# Altium footprint library Connektor.PcbLib: 305 footprints (part 18 of 20)
Each footprint in its own frame and in the unit in brackets; x right, y up, seen from the top. Pads: shape width x height; smd on the part's side, far side on the other; paste and mask are expansions set on the pad; w line width, h text height; cw(c..) or ccw(c..) is an arc to the next point about the centre after c.
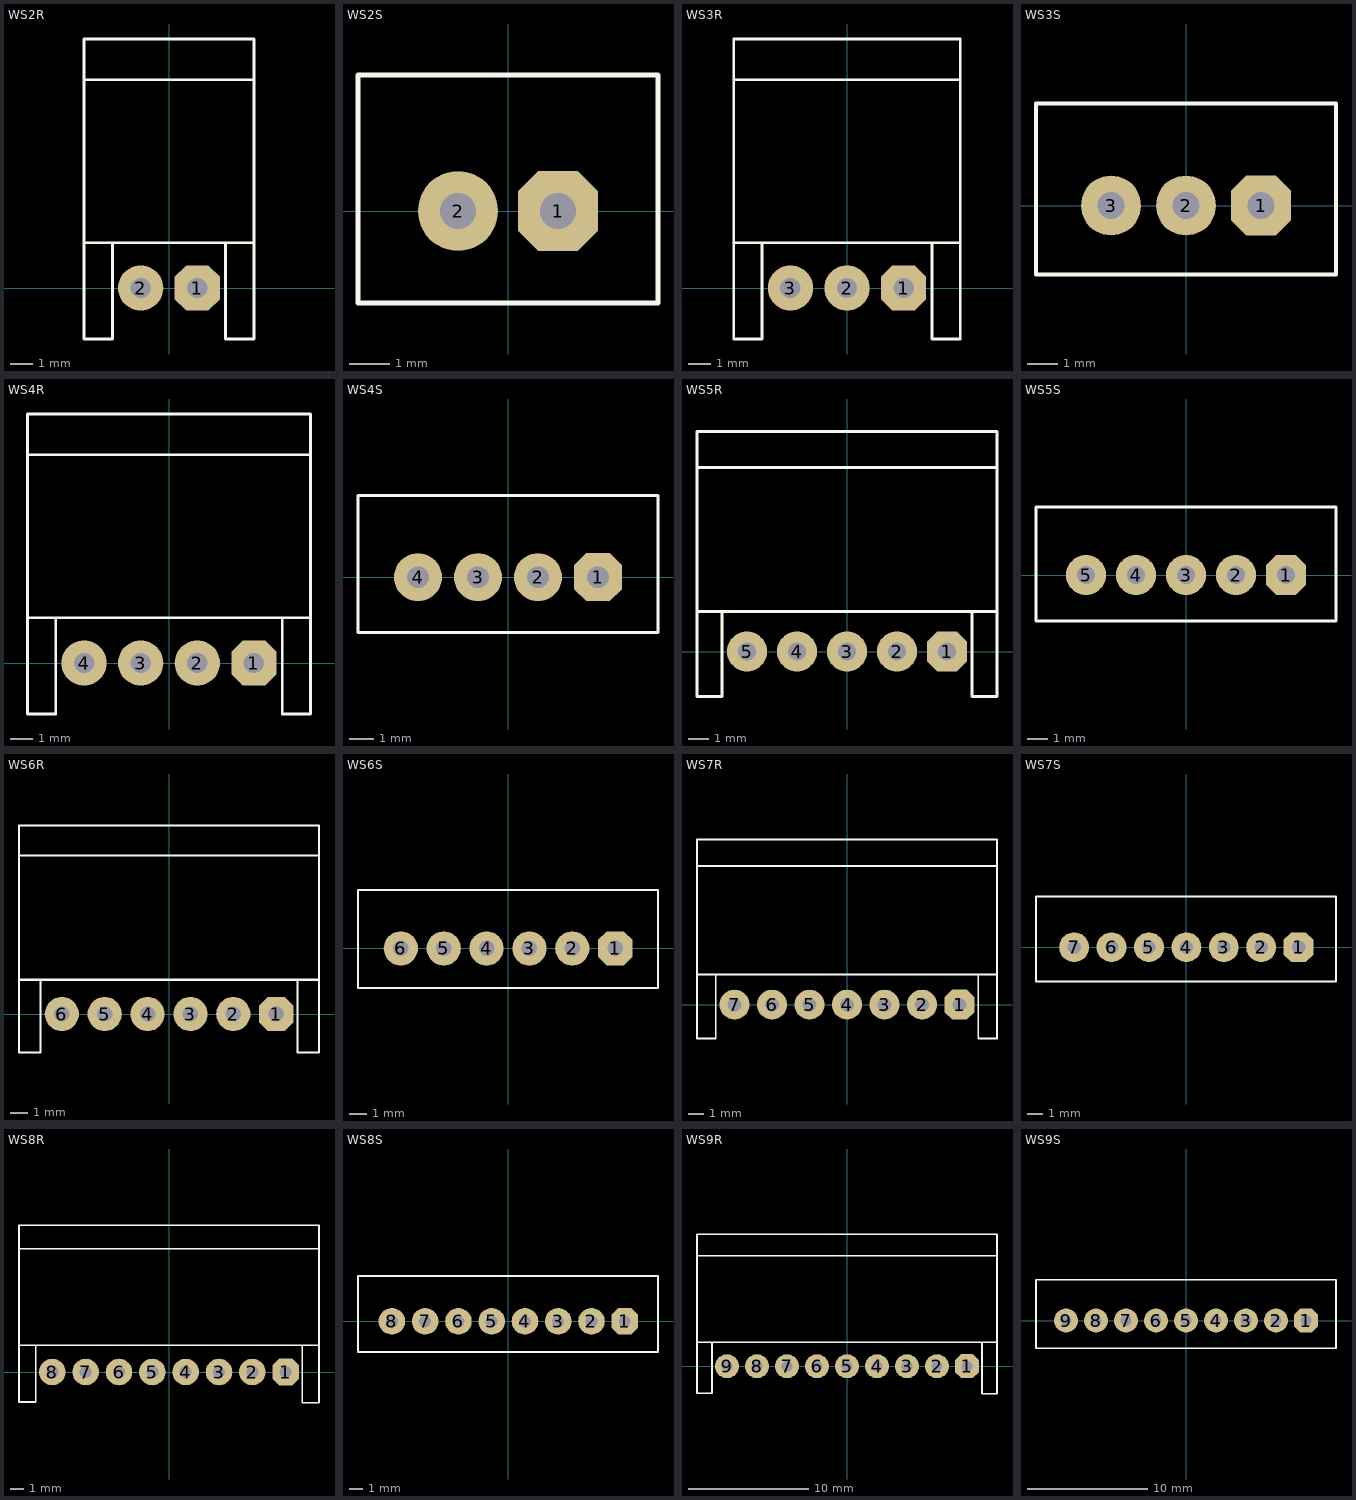
[diagram p17: the footprints below, top view; thin cyan lines are the x and y axes]

## WS2R [mm]
pads (2):
  oct 2x2 hole 0.9: 1(1.25,0)
  round 2 hole 0.9: 2(-1.25,0)
TopOverlay:
  lines w0.127: -3.75,2 3.75,2 ; -3.7,9.2 3.7,9.2 ; -2.5,2 -2.5,-2.25 -3.75,-2.25 -3.75,11 3.75,11 3.75,-2.25 2.5,-2.25 2.5,2
3D body: height 6.1, standoff -2, extent -3.7,-2.3 3.7,9.2

## WS2S [mm]
pads (2):
  oct 2x2 hole 0.9: 1(1.25,0)
  round 2 hole 0.9: 2(-1.25,0)
TopOverlay:
  lines w0.127: -3.75,-2.3 -3.75,3.4 3.75,3.4 3.75,-2.3 -3.75,-2.3
3D body: height 7.7, standoff -2.5, extent -3.75,-2.3 3.75,3.4

## WS3R [mm]
pads (3):
  oct 2x2 hole 0.9: 1(2.5,0)
  round 2 hole 0.9: 2(0,0) 3(-2.5,0)
TopOverlay:
  lines w0.127: -5,2 5,2 ; -4.95,9.2 4.95,9.2 ; -3.75,2 -3.75,-2.25 -5,-2.25 -5,11 5,11 5,-2.25 3.75,-2.25 3.75,2
3D body: height 6.1, standoff -2, extent -4.95,-2.3 4.95,9.2

## WS3S [mm]
pads (3):
  oct 2x2 hole 0.9: 1(2.5,0)
  round 2 hole 0.9: 2(0,0) 3(-2.5,0)
TopOverlay:
  lines w0.127: -5,-2.3 5,-2.3 5,3.4 -5,3.4 -5,-2.3
3D body: height 7.7, standoff -2.5, extent -5,-2.3 5,3.4

## WS4R [mm]
pads (4):
  oct 2x2 hole 0.9: 1(3.75,0)
  round 2 hole 0.9: 2(1.25,0) 3(-1.25,0) 4(-3.75,0)
TopOverlay:
  lines w0.127: -6.25,2 6.25,2 ; -6.2,9.2 6.2,9.2 ; -5,2 -5,-2.25 -6.25,-2.25 -6.25,11 6.25,11 6.25,-2.25 5,-2.25 5,2
3D body: height 6.1, standoff -2, extent -6.2,-2.3 6.2,9.2

## WS4S [mm]
pads (4):
  oct 2x2 hole 0.9: 1(3.75,0)
  round 2 hole 0.9: 2(1.25,0) 3(-1.25,0) 4(-3.75,0)
TopOverlay:
  lines w0.127: -6.25,-2.3 6.25,-2.3 6.25,3.4 -6.25,3.4 -6.25,-2.3
3D body: height 7.7, standoff -2.5, extent -6.25,-2.3 6.25,3.4

## WS5R [mm]
pads (5):
  oct 2x2 hole 0.9: 1(5,0)
  round 2 hole 0.9: 2(2.5,0) 3(0,0) 4(-2.5,0) 5(-5,0)
TopOverlay:
  lines w0.127: -7.5,2 7.5,2 ; -7.45,9.2 7.45,9.2 ; -6.25,2 -6.25,-2.25 -7.5,-2.25 -7.5,11 7.5,11 7.5,-2.25 6.25,-2.25 6.25,2
3D body: height 6.1, standoff -2, extent -7.45,-2.3 7.45,9.2

## WS5S [mm]
pads (5):
  oct 2x2 hole 0.9: 1(5,0)
  round 2 hole 0.9: 2(2.5,0) 3(0,0) 4(-2.5,0) 5(-5,0)
TopOverlay:
  lines w0.127: -7.5,-2.3 -7.5,3.4 7.5,3.4 7.5,-2.3 -7.5,-2.3
3D body: height 7.7, standoff -2.5, extent -7.5,-2.3 7.5,3.4

## WS6R [mm]
pads (6):
  oct 2x2 hole 0.9: 1(6.25,0)
  round 2 hole 0.9: 2(3.75,0) 3(1.25,0) 4(-1.25,0) 5(-3.75,0) 6(-6.25,0)
TopOverlay:
  lines w0.127: -8.75,2 8.75,2 ; -8.75,9.25 8.75,9.25 ; -7.5,2 -7.5,-2.25 -8.75,-2.25 -8.75,11 8.75,11 8.75,-2.25 7.5,-2.25 7.5,2
3D body: height 6.1, standoff -2, extent -8.7,-2.3 8.7,9.2

## WS6S [mm]
pads (6):
  oct 2x2 hole 0.9: 1(6.25,0)
  round 2 hole 0.9: 2(3.75,0) 3(1.25,0) 4(-1.25,0) 5(-3.75,0) 6(-6.25,0)
TopOverlay:
  lines w0.127: -8.75,-2.3 8.75,-2.3 8.75,3.4 -8.75,3.4 -8.75,-2.3
3D body: height 7.7, standoff -2.5, extent -8.75,-2.3 8.75,3.4

## WS7R [mm]
pads (7):
  oct 2x2 hole 0.9: 1(7.5,0)
  round 2 hole 0.9: 2(5,0) 3(2.5,0) 4(0,0) 5(-2.5,0) 6(-5,0) 7(-7.5,0)
TopOverlay:
  lines w0.127: -10,2 10,2 ; -10,9.25 10,9.25 ; -8.75,2 -8.75,-2.25 -10,-2.25 -10,11 10,11 10,-2.25 8.75,-2.25 8.75,2
3D body: height 6.1, standoff -2, extent -9.95,-2.3 9.95,9.2

## WS7S [mm]
pads (7):
  oct 2x2 hole 0.9: 1(7.5,0)
  round 2 hole 0.9: 2(5,0) 3(2.5,0) 4(0,0) 5(-2.5,0) 6(-5,0) 7(-7.5,0)
TopOverlay:
  lines w0.127: -10.05,-2.3 10,-2.3 10,3.4 -10.05,3.4 -10.05,-2.3
3D body: height 7.7, standoff -2.5, extent -10.05,-2.3 10.05,3.4

## WS8R [mm]
pads (8):
  oct 2x2 hole 0.9: 1(8.75,0)
  round 2 hole 0.9: 2(6.25,0) 3(3.75,0) 4(1.25,0) 5(-1.25,0) 6(-3.75,0) 7(-6.25,0) 8(-8.75,0)
TopOverlay:
  lines w0.127: -11.25,2 11.25,2 ; -11.2,9.25 11.25,9.25 ; -10,2 -10,-2.25 -11.25,-2.25 -11.25,11 11.25,11 11.25,-2.3 10,-2.3 10,2
3D body: height 6.1, standoff -2, extent -11.2,-2.3 11.2,9.2

## WS8S [mm]
pads (8):
  oct 2x2 hole 0.9: 1(8.75,0)
  round 2 hole 0.9: 2(6.25,0) 3(3.75,0) 4(1.25,0) 5(-1.25,0) 6(-3.75,0) 7(-6.25,0) 8(-8.75,0)
TopOverlay:
  lines w0.127: -11.3,-2.3 11.25,-2.3 11.25,3.4 -11.3,3.4 -11.3,-2.3
3D body: height 7.7, standoff -2.5, extent -11.3,-2.3 11.3,3.4

## WS9R [mm]
pads (9):
  oct 2x2 hole 0.9: 1(10,0)
  round 2 hole 0.9: 2(7.5,0) 3(5,0) 4(2.5,0) 5(0,0) 6(-2.5,0) 7(-5,0) 8(-7.5,0) 9(-10,0)
TopOverlay:
  lines w0.127: -12.5,2 12.5,2 ; -12.45,9.2 12.45,9.2 ; -11.25,2 -11.25,-2.25 -12.5,-2.25 -12.5,11 12.5,11 12.5,-2.3 11.25,-2.3 11.25,2
3D body: height 6.1, standoff -2, extent -12.45,-2.3 12.45,9.2

## WS9S [mm]
pads (9):
  oct 2x2 hole 0.9: 1(10,0)
  round 2 hole 0.9: 2(7.5,0) 3(5,0) 4(2.5,0) 5(0,0) 6(-2.5,0) 7(-5,0) 8(-7.5,0) 9(-10,0)
TopOverlay:
  lines w0.127: -12.5,-2.3 12.5,-2.3 12.5,3.4 -12.5,3.4 -12.5,-2.3
3D body: height 7.7, standoff -2.5, extent -12.55,-2.3 12.55,3.4